# Altium footprint library myLibraryAltium.PcbLib: 215 footprints (part 3 of 14)
Each footprint in its own frame and in the unit in brackets; x right, y up, seen from the top. Pads: shape width x height; smd on the part's side, far side on the other; paste and mask are expansions set on the pad; w line width, h text height; cw(c..) or ccw(c..) is an arc to the next point about the centre after c.
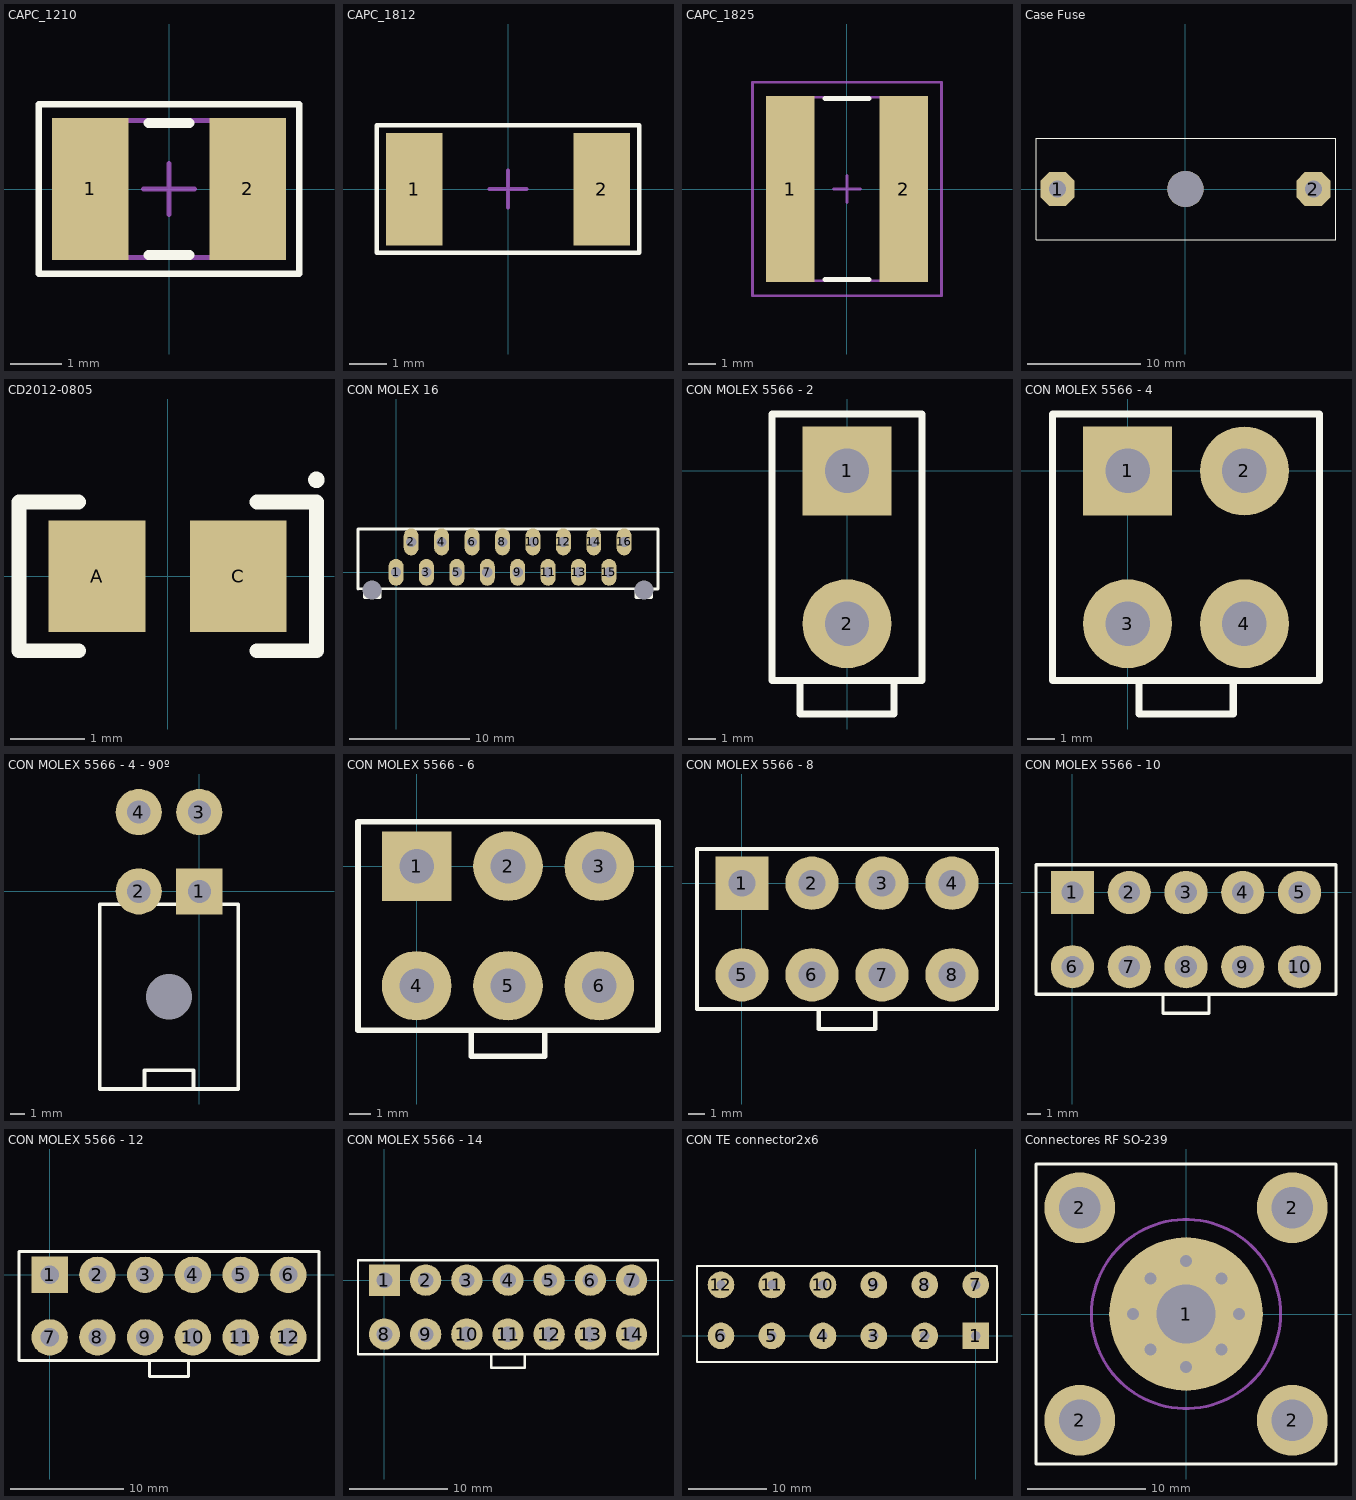
[diagram p2: the footprints below, top view; thin cyan lines are the x and y axes]

## CAPC_1210 [mm] "Chip Capacitor, Body 3.2x2.5mm, IPC Low Density"
height 1.35
pads (2):
  rect 1.5x2.8 smd: 1(-1.55,0) 2(1.55,0)
Top Overlay:
  lines w0.127: -2.565,-1.665 -2.565,1.665 2.565,1.665 2.565,-1.665 -2.565,-1.665
  lines w0.2: -0.4,-1.3 0.4,-1.3 ; -0.4,1.3 0.4,1.3
Mechanical 13:
  lines w0.1: -1.7,-1.35 -1.7,1.35 1.7,1.35 1.7,-1.35 -1.7,-1.35
Mechanical 15:
  lines w0.1: -0.5,0 0.5,0 ; 0,-0.5 0,0.5
3D body: height 1.35, standoff 0, extent -1.7,-1.35 1.7,1.35

## CAPC_1812 [mm] "Chip Capacitor"
height 1.1
pads (2):
  rect 1.5x3 smd: 1(-2.5,0) 2(2.5,0)
Top Overlay:
  lines w0.127: -3.5,1.7 -3.5,-1.7 3.5,-1.7 3.5,1.7 -3.5,1.702
Mechanical 15:
  lines w0.1: -0.5,0 0.5,0 ; 0,-0.5 0,0.5
3D body "User Library-SMD Ceramic Capacitors_1812 (4532)_GE.STEP": height 1.3, standoff 0, extent -2.304,-1.6 2.304,1.6

## CAPC_1825 [mm] "Chip Capacitor, Body 4.5x6.4mm, IPC Low Density"
height 1.1
pads (2):
  rect 1.8x6.9 smd: 1(-2.1,0) 2(2.1,0)
Top Overlay:
  lines w0.2: -0.8,-3.35 0.8,-3.35 ; -0.8,3.35 0.8,3.35
Mechanical 13:
  lines w0.1: -2.4,-3.4 2.4,-3.4 2.4,3.4 -2.4,3.4 -2.4,-3.4
Mechanical 15:
  lines w0.1: -0.5,0 0.5,0 ; 0,-0.5 0,0.5 ; -3.5,-3.95 3.5,-3.95 3.5,3.95 -3.5,3.95 -3.5,-3.95
3D body: height 1.1, standoff 0, extent -2.4,-3.4 2.4,3.4

## Case Fuse [mm] "PCB mount fuse holder, 5x20mm"
pads (3):
  oct 3x3 hole 1.5: 1(-11.3,0) 2(11.3,0)
  round 3.2 hole 3.2 unplated: ""(0,0)
Top Overlay:
  lines w0.1: -13.2,-4.5 13.3,-4.5 13.3,4.5 -13.2,4.5 -13.2,-4.5

## CD2012-0805 [mm] "Chip Diode; Body 2.0 x 1.3 mm (LxW typ)"
height 1.1
pads (2):
  rect 1.3x1.5 smd: A(-0.95,0) C(0.95,0)
Top Overlay:
  circle w0.15: c2,1.3 r0.035
  lines w0.2: -1.2,-1 -2,-1 -2,1 -1.2,1 ; 1.2,-1 2,-1 2,1 1.2,1
3D body "User Library-CHIPLED-0805.STEP": height 0.9, standoff -0.01, extent -1.05,-0.675 1.05,0.675

## CON MOLEX 16 [mm]
pads (18):
  round 0 hole 1.6: 0(-2,-1.48) 0(20.7,-1.48)
  oval 1.25x2.25 hole 0.85: 1(0,0) 2(1.27,2.54) 3(2.54,0) 4(3.81,2.54) 5(5.08,0) 6(6.35,2.54) 7(7.62,0) 8(8.89,2.54) 9(10.16,0) 10(11.43,2.54) 11(12.7,0) 12(13.97,2.54) 13(15.24,0) 14(16.51,2.54) 15(17.78,0) 16(19.05,2.54)
Top Overlay:
  lines w0.254: -2.639,-2.079 -2.639,-1.368 -3.175,-1.376 -3.175,3.624 21.875,3.624 21.875,-1.376 21.339,-1.385 21.339,-2.122 20.069,-2.122 ; -2.613,-2.104 -1.343,-2.104 -1.343,-1.368 20.043,-1.385 20.043,-2.096

## CON MOLEX 5566 - 2 [mm]
pads (2):
  rect 3.2x3.2 hole 1.6: 1(0,0)
  round 3.2 hole 1.6: 2(0,-5.5)
Top Overlay:
  lines w0.254: -1.7,-7.55 -1.7,-8.75 1.7,-8.75 1.7,-7.55 ; -2.7,-7.55 -2.7,2.05 2.7,2.05 2.7,-7.55 -2.7,-7.55

## CON MOLEX 5566 - 4 [mm]
pads (4):
  rect 3.2x3.2 hole 1.6: 1(0,0)
  round 3.2 hole 1.6: 2(4.2,0) 3(0,-5.5) 4(4.2,-5.5)
Top Overlay:
  lines w0.254: 0.4,-7.55 0.4,-8.75 3.8,-8.75 3.8,-7.55 ; -2.7,-7.55 6.9,-7.55 6.9,2.05 -2.7,2.05 -2.7,-7.55

## CON MOLEX 5566 - 4 - 90º [mm]
pads (5):
  round 0 hole 3.17: 0(-2.1,-7.3)
  rect 3.2x3.2 hole 1.6: 1(0,0)
  round 3.2 hole 1.6: 2(-4.2,0) 3(0,5.5) 4(-4.2,5.5)
Top Overlay:
  lines w0.254: -3.8,-13.6 -3.8,-12.4 -0.4,-12.4 -0.4,-13.6 ; -6.9,-13.7 2.7,-13.7 2.7,-0.9 -6.9,-0.9 -6.9,-13.7

## CON MOLEX 5566 - 6 [mm]
pads (6):
  rect 3.2x3.2 hole 1.6: 1(0,0)
  round 3.2 hole 1.6: 2(4.2,0) 3(8.4,0) 4(0,-5.5) 5(4.2,-5.5) 6(8.4,-5.5)
Top Overlay:
  lines w0.254: 2.5,-7.55 2.5,-8.75 5.9,-8.75 5.9,-7.55 ; -2.7,-7.55 11.1,-7.55 11.1,2.05 -2.7,2.05 -2.7,-7.55

## CON MOLEX 5566 - 8 [mm]
pads (8):
  rect 3.2x3.2 hole 1.6: 1(0,0)
  round 3.2 hole 1.6: 2(4.2,0) 3(8.4,0) 4(12.6,0) 5(0,-5.5) 6(4.2,-5.5) 7(8.4,-5.5) 8(12.6,-5.5)
Top Overlay:
  lines w0.254: 4.6,-7.55 4.6,-8.75 8,-8.75 8,-7.55 ; -2.7,-7.55 -2.7,2.05 15.3,2.05 15.3,-7.55 -2.7,-7.55

## CON MOLEX 5566 - 10 [mm]
pads (10):
  rect 3.2x3.2 hole 1.6: 1(0,0)
  round 3.2 hole 1.6: 2(4.2,0) 3(8.4,0) 4(12.6,0) 5(16.8,0) 6(0,-5.5) 7(4.2,-5.5) 8(8.4,-5.5) 9(12.6,-5.5) 10(16.8,-5.5)
Top Overlay:
  lines w0.254: 6.7,-7.55 6.7,-8.95 10.1,-8.95 10.1,-7.55 ; -2.7,-7.55 -2.7,2.05 19.5,2.05 19.5,-7.55 -2.7,-7.55

## CON MOLEX 5566 - 12 [mm]
pads (12):
  rect 3.2x3.2 hole 1.6: 1(0,0)
  round 3.2 hole 1.6: 2(4.2,0) 3(8.4,0) 4(12.6,0) 5(16.8,0) 6(21,0) 7(0,-5.5) 8(4.2,-5.5) 9(8.4,-5.5) 10(12.6,-5.5) 11(16.8,-5.5) 12(21,-5.5)
Top Overlay:
  lines w0.254: 8.8,-7.55 8.8,-8.95 12.2,-8.95 12.2,-7.55 ; -2.7,-7.55 -2.7,2.05 23.7,2.05 23.7,-7.55 -2.7,-7.55

## CON MOLEX 5566 - 14 [mm]
pads (14):
  rect 3.2x3.2 hole 1.6: 1(0,0)
  round 3.2 hole 1.6: 2(4.2,0) 3(8.4,0) 4(12.6,0) 5(16.8,0) 6(21,0) 7(25.2,0) 8(0,-5.5) 9(4.2,-5.5) 10(8.4,-5.5) 11(12.6,-5.5) 12(16.8,-5.5) 13(21,-5.5) 14(25.2,-5.5)
Top Overlay:
  lines w0.254: 10.9,-7.55 10.9,-8.95 14.3,-8.95 14.3,-7.55 ; -2.7,-7.55 -2.7,2.05 27.9,2.05 27.9,-7.55 -2.7,-7.55

## CON TE connector2x6 [mm]
pads (12):
  rect 3.4x3.4 hole 1.2: 1(0,0)
  round 3.4 hole 1.2: 2(-6.5,0) 3(-13,0) 4(-19.5,0) 5(-26,0) 6(-32.5,0) 7(0,6.5) 8(-6.5,6.5) 9(-13,6.5) 10(-19.5,6.5) 11(-26,6.5) 12(-32.5,6.5)
Top Overlay:
  lines w0.254: -35.56,-3.302 -35.56,8.89 2.7,8.89 2.7,-3.302 -35.56,-3.302
3D body "c-917353-1-e-3d.stp": height 15, standoff -3.49, extent -35.256,-6.377 2.744,10.973

## Connectores RF SO-239 [mm]
pads (5):
  round 13 hole 5: 1(0,0)
  round 6 hole 3.5: 2(-9,-9) 2(-9,9) 2(9,-9) 2(9,9)
via -3,-3 diameter 2 hole 1
via 3,3 diameter 2 hole 1
via -3,3 diameter 2 hole 1
via 3,-3 diameter 2 hole 1
via 0,-4.5 diameter 2 hole 1
via 0,4.5 diameter 2 hole 1
via 4.5,0 diameter 2 hole 1
via -4.5,0 diameter 2 hole 1
Top Overlay:
  lines w0.254: -12.7,-12.7 -12.7,12.7 12.7,12.7 12.7,-12.7 -12.7,-12.7
Mechanical 1:
  circle w0.254: c0,0 r8